# Altium footprint library Connektor.PcbLib: 305 footprints (part 2 of 20)
Each footprint in its own frame and in the unit in brackets; x right, y up, seen from the top. Pads: shape width x height; smd on the part's side, far side on the other; paste and mask are expansions set on the pad; w line width, h text height; cw(c..) or ccw(c..) is an arc to the next point about the centre after c.
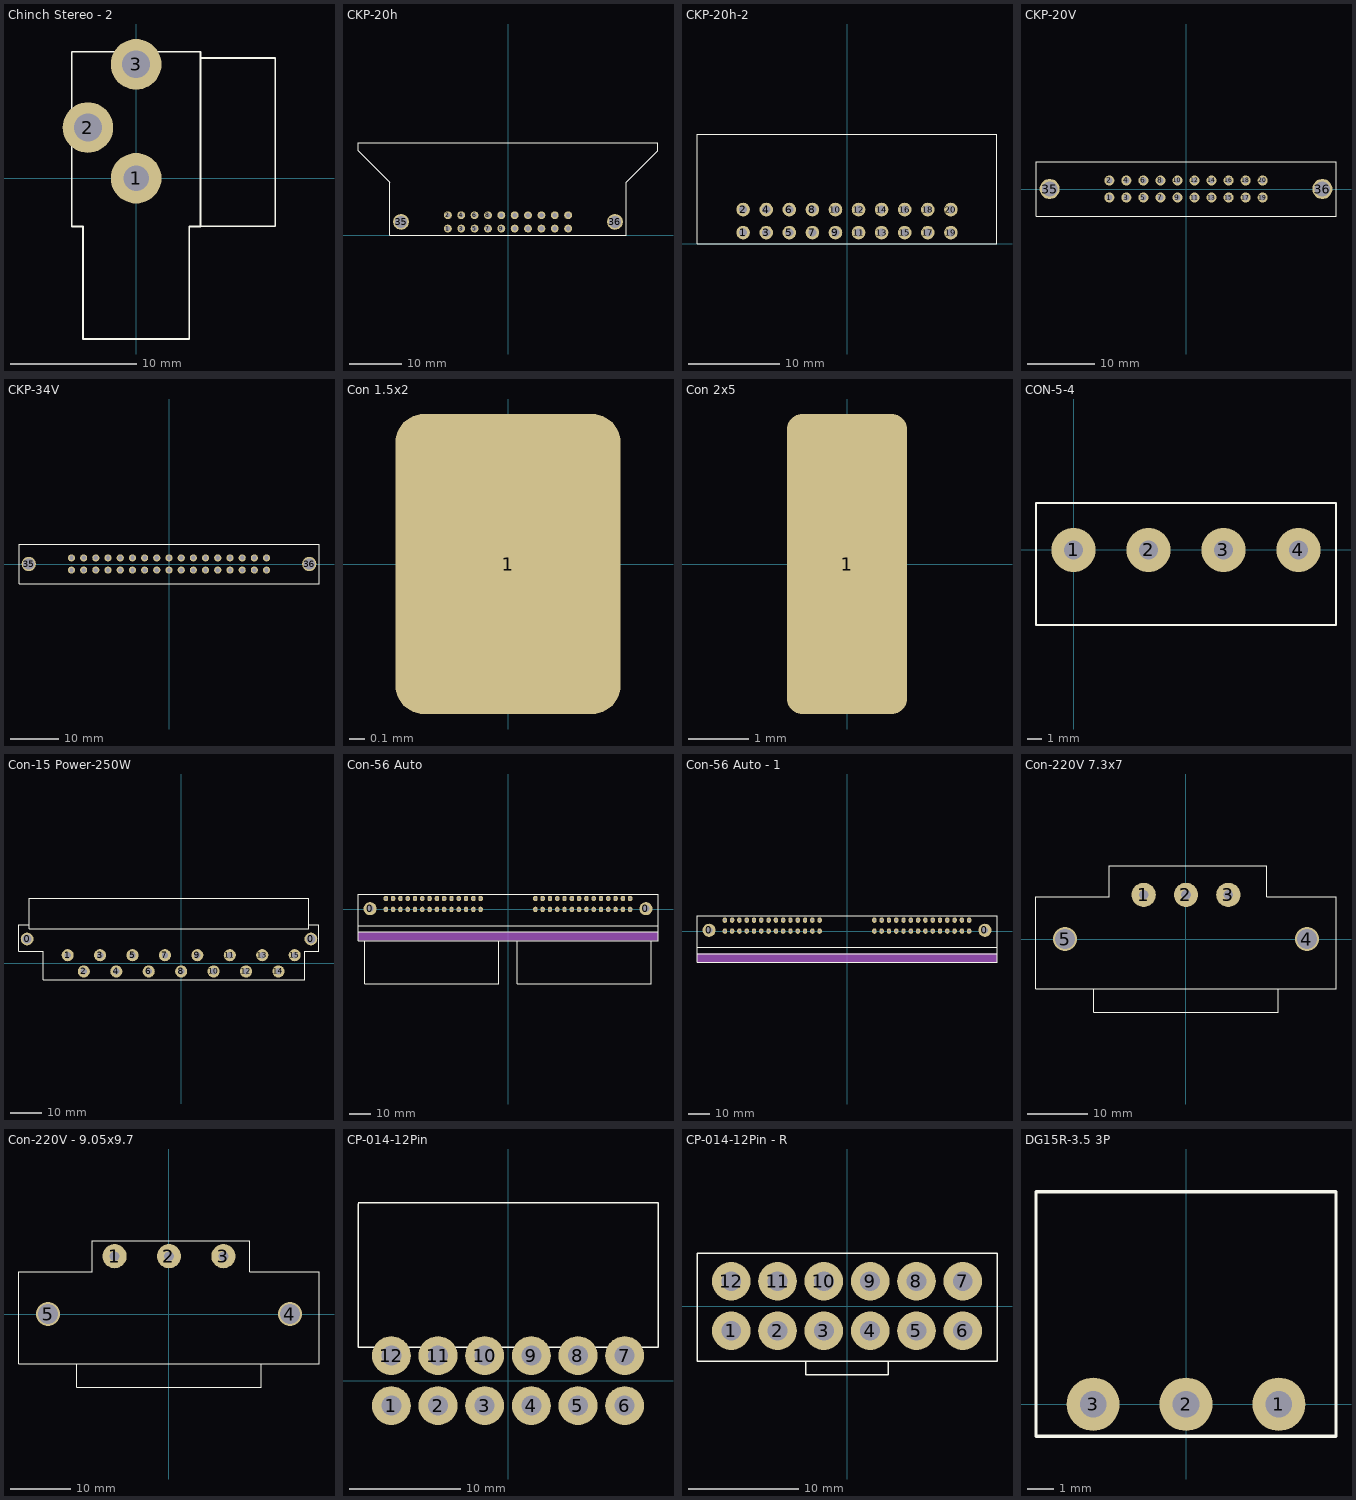
[diagram p1: the footprints below, top view; thin cyan lines are the x and y axes]

## Chinch Stereo - 2 [mm]
pads (3):
  round 4 hole 2: 1(0,0)
  round 4 hole 2.2: 2(-3.81,4) 3(0,9)
TopOverlay:
  lines w0.127: 5.1,-3.8 11,-3.8 11,9.5 5.1,9.5 ; -5.08,-3.81 -4.2,-3.81 -4.2,-12.7 4.2,-12.7 4.2,-3.81 5.08,-3.81 5.08,10 -5.08,10 -5.08,-3.81

## CKP-20h [mm]
pads (22):
  round 1.5 hole 0.9: 1(-11.43,1.23) 2(-11.43,3.77) 3(-8.89,1.23) 4(-8.89,3.77) 5(-6.35,1.23) 6(-6.35,3.77) 7(-3.81,1.23) 8(-3.81,3.77) 9(-1.27,1.23) 10(-1.27,3.77) 11(1.27,1.23) 12(1.27,3.77) 13(3.81,1.23) 14(3.81,3.77) 15(6.35,1.23) 16(6.35,3.77) 17(8.89,1.23) 18(8.89,3.77) 19(11.43,1.23) 20(11.43,3.77)
  round 3 hole 2.3: 35(-20.32,2.5) 36(20.32,2.5)
TopOverlay:
  lines w0.127: -28.5,16 -22.5,10 -22.5,0 22.5,0 22.5,10 28.5,16 28.5,17.5 27.5,17.5 -28.5,17.5 -28.5,16.5 -28.5,16

## CKP-20h-2 [mm]
pads (20):
  round 1.5 hole 0.9: 1(-11.43,1.23) 2(-11.43,3.77) 3(-8.89,1.23) 4(-8.89,3.77) 5(-6.35,1.23) 6(-6.35,3.77) 7(-3.81,1.23) 8(-3.81,3.77) 9(-1.27,1.23) 10(-1.27,3.77) 11(1.27,1.23) 12(1.27,3.77) 13(3.81,1.23) 14(3.81,3.77) 15(6.35,1.23) 16(6.35,3.77) 17(8.89,1.23) 18(8.89,3.77) 19(11.43,1.23) 20(11.43,3.77)
TopOverlay:
  lines w0.127: 16.5,0 -16.51,0 -16.51,12.065 16.51,12.065 16.51,0

## CKP-20V [mm]
pads (22):
  round 1.5 hole 0.9: 1(-11.43,-1.27) 2(-11.43,1.27) 3(-8.89,-1.27) 4(-8.89,1.27) 5(-6.35,-1.27) 6(-6.35,1.27) 7(-3.81,-1.27) 8(-3.81,1.27) 9(-1.27,-1.27) 10(-1.27,1.27) 11(1.27,-1.27) 12(1.27,1.27) 13(3.81,-1.27) 14(3.81,1.27) 15(6.35,-1.27) 16(6.35,1.27) 17(8.89,-1.27) 18(8.89,1.27) 19(11.43,-1.27) 20(11.43,1.27)
  round 3 hole 2.3: 35(-20.32,0) 36(20.32,0)
TopOverlay:
  lines w0.127: -22.352,-4.064 22.352,-4.064 22.352,4.064 -22.352,4.064 -22.352,-4.064

## CKP-34V [mm]
pads (36):
  round 1.5 hole 0.9: 1(-20.32,-1.27) 2(-20.32,1.27) 3(-17.78,-1.27) 4(-17.78,1.27) 5(-15.24,-1.27) 6(-15.24,1.27) 7(-12.7,-1.27) 8(-12.7,1.27) 9(-10.16,-1.27) 10(-10.16,1.27) 11(-7.62,-1.27) 12(-7.62,1.27) 13(-5.08,-1.27) 14(-5.08,1.27) 15(-2.54,-1.27) 16(-2.54,1.27) 17(0,-1.27) 18(0,1.27) 19(2.54,-1.27) 20(2.54,1.27) 21(5.08,-1.27) 22(5.08,1.27) 23(7.62,-1.27) 24(7.62,1.27) 25(10.16,-1.27) 26(10.16,1.27) 27(12.7,-1.27) 28(12.7,1.27) 29(15.24,-1.27) 30(15.24,1.27) 31(17.78,-1.27) 32(17.78,1.27) 33(20.32,-1.27) 34(20.32,1.27)
  round 3 hole 2.3: 35(-29.21,0) 36(29.21,0)
TopOverlay:
  lines w0.127: -31.242,-4.064 -31.242,4.064 31.242,4.064 31.242,-4.064 -31.242,-4.064

## Con 1.5x2 [mm]
pads (1):
  rrect25% 1.5x2 smd: 1(0,0)

## Con 2x5 [mm]
pads (1):
  rrect25% 2x5 smd: 1(0,0)

## CON-5-4 [mm]
pads (4):
  round 3 hole 1.3: 1(0,0) 2(5.08,0) 3(10.16,0) 4(15.24,0)
TopOverlay:
  lines w0.127: -2.54,-5.08 17.78,-5.08 17.78,3.175 -2.54,3.175 -2.54,-5.08

## Con-15 Power-250W [mm]
pads (17):
  round 4 hole 2.8: 0(-48.26,7.62) 0(40.64,7.62)
  round 3.8 hole 2: 1(-35.56,2.54) 2(-30.48,-2.54) 3(-25.4,2.54) 4(-20.32,-2.54) 5(-15.24,2.54) 6(-10.16,-2.54) 7(-5.08,2.54) 8(0,-2.54) 9(5.08,2.54) 10(10.16,-2.54) 11(15.24,2.54) 12(20.32,-2.54) 13(25.4,2.54) 14(30.48,-2.54) 15(35.56,2.54)
TopOverlay:
  lines w0.1: -47.625,12.065 -47.625,10.795 40.005,10.795 40.005,12.065 ; -47.625,12.065 -50.8,12.065 -50.8,3.81 -43.18,3.81 -43.18,-5.08 38.735,-5.08 38.735,3.81 43.18,3.81 43.18,12.065 40.005,12.065 ; -47.625,12.065 -47.625,20.32 40.005,20.32 40.005,12.065
3D body: height 6, standoff 0, extent -50.8,3.81 -43.18,12.065
3D body: height 6, standoff 0, extent 35.56,-5.08 43.18,12.065
3D body: height 11, standoff -3.5, extent -47.625,10.795 40.005,20.32
3D body: height 11, standoff 0, extent -43.18,-5.08 35.56,10.795

## Con-56 Auto [mm]
pads (58):
  round 6 hole 3.2: 0(-63,0.35) 0(63,0.35)
  oval 2x2.5 hole 1: 1(-55.79,5) 2(-52.46,5) 3(-49.13,5) 4(-45.8,5) 5(-42.47,5) 6(-39.14,5) 7(-35.81,5) 8(-32.48,5) 9(-29.15,5) 10(-25.82,5) 11(-22.49,5) 12(-19.16,5) 13(-15.83,5) 14(-12.5,5) 15(12.5,5) 16(15.83,5) 17(19.16,5) 18(22.49,5) 19(25.82,5) 20(29.15,5) 21(32.48,5) 22(35.81,5) 23(39.14,5) 24(42.47,5) 25(45.8,5) 26(49.13,5) 27(52.46,5) 28(55.79,5) 29(-55.79,0) 30(-52.46,0) 31(-49.13,0) 32(-45.8,0) 33(-42.47,0) 34(-39.14,0) 35(-35.81,0) 36(-32.48,0) 37(-29.15,0) 38(-25.82,0) 39(-22.49,0) 40(-19.16,0) 41(-15.83,0) 42(-12.5,0) 43(12.5,0) 44(15.83,0) 45(19.16,0) 46(22.49,0) 47(25.82,0) 48(29.15,0) 49(32.48,0) 50(35.81,0) 51(39.14,0) 52(42.47,0) 53(45.8,0) 54(49.13,0) 55(52.46,0) 56(55.79,0)
TopOverlay:
  lines w0.127: -68.5,-10.25 68.5,-10.25 ; -68.5,-7.45 68.5,-7.45 ; -65.5,-14.25 -65.5,-34 -4.29,-34 -4.29,-14.25 ; 4.29,-14.25 4.29,-34 65.5,-34 65.5,-14.25 ; -68.5,-14.25 -68.5,7 68.5,7 68.5,-14.25 -68.5,-14.25
Mechanical1:
  rectangle: -68.5,-14.25 68.5,-10.25

## Con-56 Auto - 1 [mm]
pads (58):
  round 6 hole 3: 0(-63,0.35) 0(63,0.35)
  oval 2x2.5 hole 1: 1(-55.79,5) 2(-52.46,5) 3(-49.13,5) 4(-45.8,5) 5(-42.47,5) 6(-39.14,5) 7(-35.81,5) 8(-32.48,5) 9(-29.15,5) 10(-25.82,5) 11(-22.49,5) 12(-19.16,5) 13(-15.83,5) 14(-12.5,5) 15(12.5,5) 16(15.83,5) 17(19.16,5) 18(22.49,5) 19(25.82,5) 20(29.15,5) 21(32.48,5) 22(35.81,5) 23(39.14,5) 24(42.47,5) 25(45.8,5) 26(49.13,5) 27(52.46,5) 28(55.79,5) 29(-55.79,0) 30(-52.46,0) 31(-49.13,0) 32(-45.8,0) 33(-42.47,0) 34(-39.14,0) 35(-35.81,0) 36(-32.48,0) 37(-29.15,0) 38(-25.82,0) 39(-22.49,0) 40(-19.16,0) 41(-15.83,0) 42(-12.5,0) 43(12.5,0) 44(15.83,0) 45(19.16,0) 46(22.49,0) 47(25.82,0) 48(29.15,0) 49(32.48,0) 50(35.81,0) 51(39.14,0) 52(42.47,0) 53(45.8,0) 54(49.13,0) 55(52.46,0) 56(55.79,0)
TopOverlay:
  lines w0.127: -68.5,-10.25 68.5,-10.25 ; -68.5,-7.45 68.5,-7.45 ; -68.5,-14.25 -68.5,7 68.5,7 68.5,-14.25 -68.5,-14.25
Mechanical1:
  rectangle: -68.5,-14.25 68.5,-10.25

## Con-220V 7.3x7 [mm]
pads (5):
  round 4 hole 1.6: 1(-7,7.3) 2(0,7.3) 3(7,7.3)
  round 4 hole 3.3: 4(20,0) 5(-20,0)
TopOverlay:
  lines w0.2: -15.24,-8.255 -15.24,-12.15 15.24,-12.15 15.24,-8.255 ; -24.8,-8.255 24.8,-8.255 24.8,6.985 13.335,6.985 13.335,12.15 -12.7,12.15 -12.7,6.985 -24.8,6.985 -24.8,-8.255
3D body: height 30.5, standoff -3.5, extent -24.8,-12.15 24.8,12.15

## Con-220V - 9.05x9.7 [mm]
pads (5):
  round 4 hole 1.6: 1(-9,9.55) 2(0,9.55) 3(9,9.55)
  round 4 hole 3.3: 4(20,0) 5(-20,0)
TopOverlay:
  lines w0.2: -15.24,-8.255 -15.24,-12.15 15.24,-12.15 15.24,-8.255 ; -24.8,-8.255 24.8,-8.255 24.8,6.985 13.335,6.985 13.335,12.15 -12.7,12.15 -12.7,6.985 -24.8,6.985 -24.8,-8.255
3D body: height 30.5, standoff -3.5, extent -24.8,-12.15 24.8,12.15

## CP-014-12Pin [mm]
pads (12):
  round 3.5 hole 1.8: 1(-10.5,-2.25) 2(-6.3,-2.25) 3(-2.1,-2.25) 4(2.1,-2.25) 5(6.3,-2.25) 6(10.5,-2.25) 7(10.5,2.25) 8(6.3,2.25) 9(2.1,2.25) 10(-2.1,2.25) 11(-6.3,2.25) 12(-10.5,2.25)
TopOverlay:
  lines w0.127: -13.5,15.9 -13.5,3 13.5,3 13.5,16 -13.5,16

## CP-014-12Pin - R [mm]
pads (12):
  round 3.5 hole 1.8: 1(-10.5,-2.25) 2(-6.3,-2.25) 3(-2.1,-2.25) 4(2.1,-2.25) 5(6.3,-2.25) 6(10.5,-2.25) 7(10.5,2.25) 8(6.3,2.25) 9(2.1,2.25) 10(-2.1,2.25) 11(-6.3,2.25) 12(-10.5,2.25)
TopOverlay:
  lines w0.127: -3.75,-5 -3.75,-6.25 3.75,-6.25 3.75,-5 ; -13.6,-5 13.6,-5 13.6,4.8 -13.6,4.8 -13.6,-5
3D body: height 12.8, standoff -3.5, extent -13.6,-6.2 13.6,4.8

## DG15R-3.5 3P [mm]
pads (3):
  round 2 hole 1: 1(3.5,0) 2(0,0) 3(-3.5,0)
TopOverlay:
  lines w0.127: -5.65,-1.2 -5.65,8 5.65,8 5.65,-1.2 -5.65,-1.2